# Altium footprint library Ahaltech BMS.PcbLib: 33 footprints (part 2 of 3)
Each footprint in its own frame and in the unit in brackets; x right, y up, seen from the top. Pads: shape width x height; smd on the part's side, far side on the other; paste and mask are expansions set on the pad; w line width, h text height; cw(c..) or ccw(c..) is an arc to the next point about the centre after c.
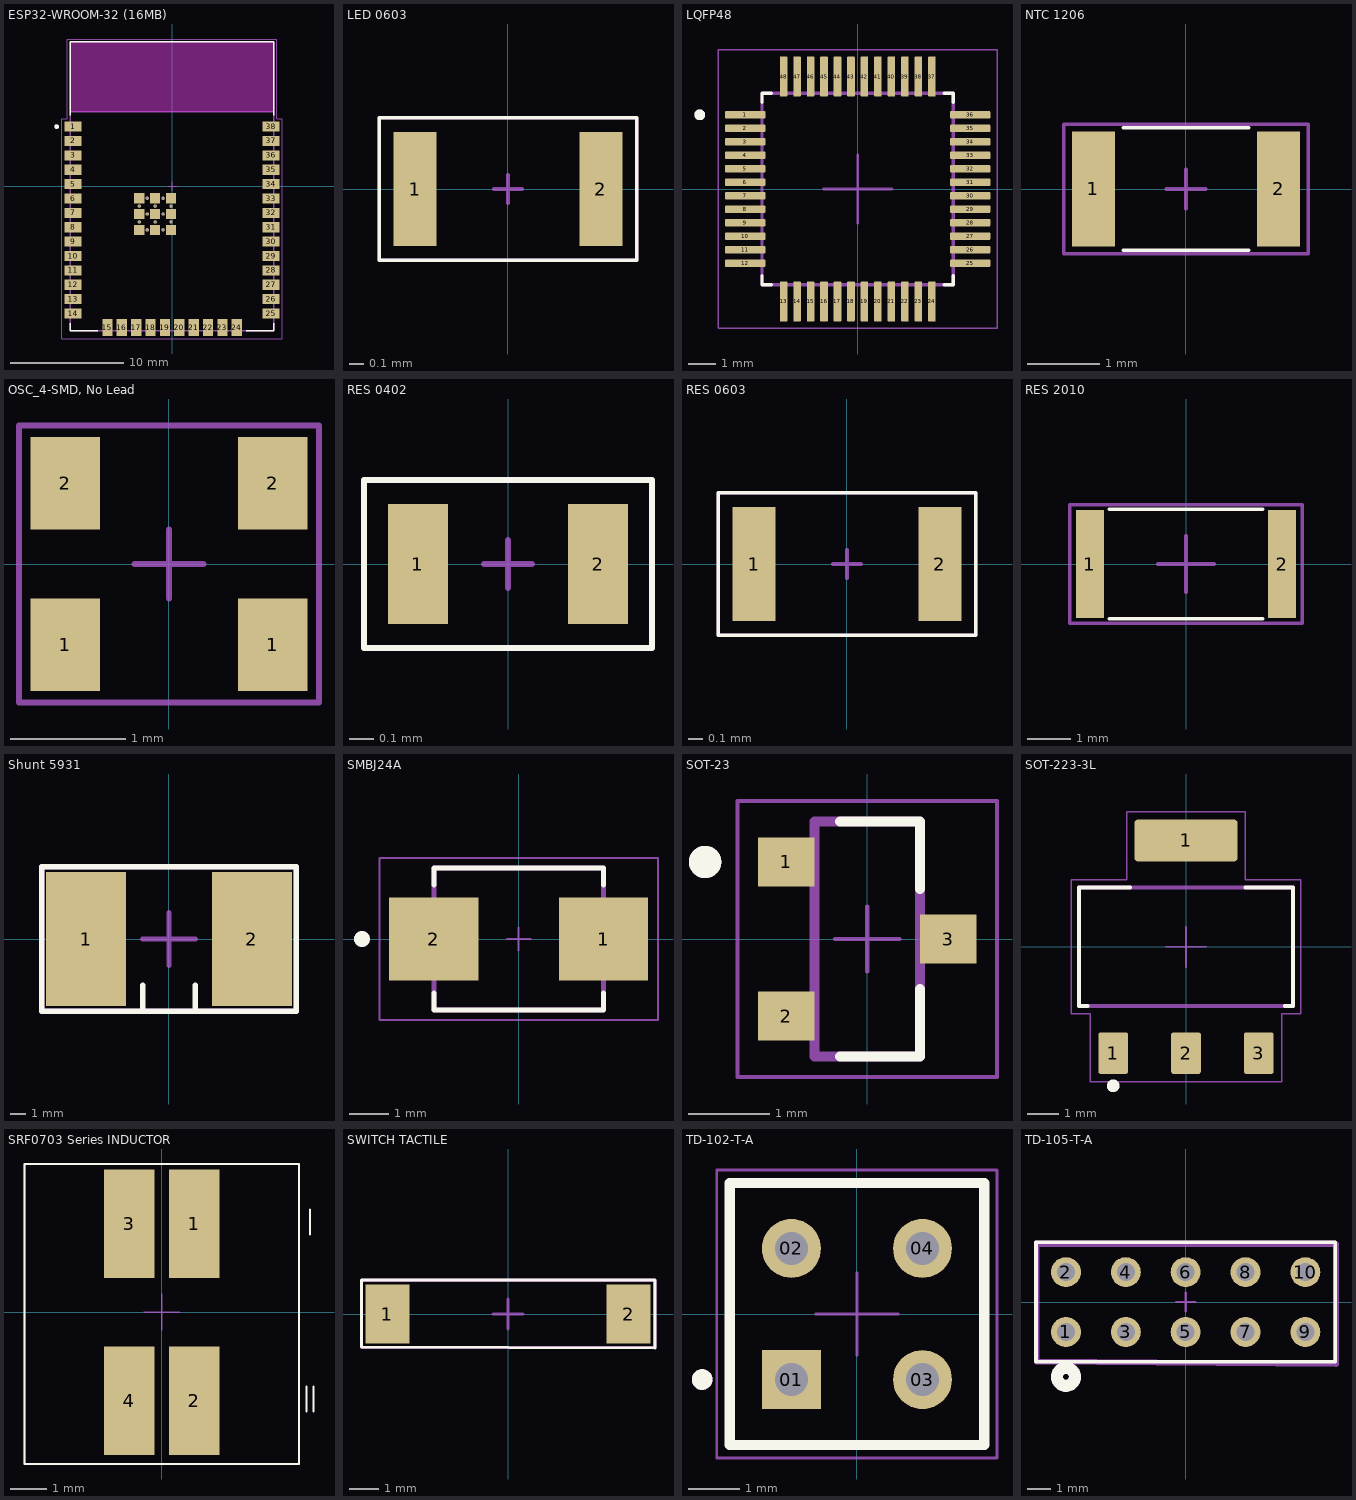
[diagram p1: the footprints below, top view; thin cyan lines are the x and y axes]

## ESP32-WROOM-32 (16MB) [mm]
pads (59):
  rect 1.5x0.9 smd: 1(-8.75,5.26) 2(-8.75,3.99) 3(-8.75,2.72) 4(-8.75,1.45) 5(-8.75,0.18) 6(-8.75,-1.09) 7(-8.75,-2.36) 8(-8.75,-3.63) 9(-8.75,-4.9) 10(-8.75,-6.17) 11(-8.75,-7.44) 12(-8.75,-8.71) 13(-8.75,-9.98) 14(-8.75,-11.25) 25(8.75,-11.25) 26(8.75,-9.98) 27(8.75,-8.71) 28(8.75,-7.44) 29(8.75,-6.17) 30(8.75,-4.9) 31(8.75,-3.63) 32(8.75,-2.36) 33(8.75,-1.09) 34(8.75,0.18) 35(8.75,1.45) 36(8.75,2.72) 37(8.75,3.99) 38(8.75,5.26)
  rect 0.9x1.5 smd: 15(-5.715,-12.5) 16(-4.445,-12.5) 17(-3.175,-12.5) 18(-1.905,-12.5) 19(-0.635,-12.5) 20(0.635,-12.5) 21(1.905,-12.5) 22(3.175,-12.5) 23(4.445,-12.5) 24(5.715,-12.5)
  rect 0.9x0.9 smd: 39_1(-2.9,-1.06) 39_2(-1.5,-1.06) 39_3(-0.1,-1.06) 39_4(-2.9,-2.46) 39_5(-1.5,-2.46) 39_6(-0.1,-2.46) 39_7(-2.9,-3.86) 39_8(-1.5,-3.86) 39_9(-0.1,-3.86)
  round 0.3 hole 0.2 mask+0: 39_10(-2.2,-1.06) 39_11(-0.8,-1.06) 39_12(-2.9,-1.76) 39_13(-1.5,-1.76) 39_14(-0.1,-1.76) 39_15(-2.2,-2.46) 39_16(-0.8,-2.46) 39_17(-2.9,-3.16) 39_18(-1.5,-3.16) 39_19(-0.1,-3.16) 39_20(-2.2,-3.86) 39_21(-0.8,-3.86)
Top Overlay:
  circle w0.2: c-10.2,5.26 r0.1
  lines w0.127: -9,-12.1 -9,-12.75 -6.55,-12.75 ; -9,6.25 -9,12.75 9,12.75 9,6.25 ; 6.55,-12.75 9,-12.75 9,-12.1
Keep-Out Layer:
  region: 9,6.56 -9,6.56 -9,12.75 9,12.75
Top Component Center:
  lines w0.05: -0.4,0 0,0 ; 0,-0.4 0,0 ; 0,0.4 0,0 ; 0.4,0 0,0 ; -9.75,-13.5 -9.75,5.96 -9.25,5.96 -9.25,13 9.25,13 9.25,5.96 9.75,5.96 9.75,-13.5 -9.75,-13.5
Top Designator:
  circle w0.2: c-10.2,5.26 r0.1
  lines w0.127: -9,6.56 9,6.56 ; -9,6.56 -9,12.75 9,12.75 9,6.56 ; -9,6.56 -9,-12.75 9,-12.75 9,6.56
  text ".Designator" at -1.2,-0.234 h2
  text "ANTENNA" at -6,9 h1.78
3D body "step_temp.STEP": height 3.25, standoff 0, extent -9,-12.75 9,12.75

## LED 0603 [mm]
pads (2):
  rect 0.3x0.8 smd mask+0.08: 1(-0.65,0) 2(0.65,0)
Top Overlay:
  lines w0.025: -0.9,-0.5 0.9,-0.5 0.9,0.5 0.2,0.5 -0.9,0.5 -0.9,-0.5
Top Component Center:
  lines w0.025: -0.1,0 0,0 ; 0,-0.1 0,0 ; 0,0.1 0,0 ; 0.1,0 0,0 ; -0.9,-0.5 -0.9,0.5 -0.5,0.5 0.9,0.5 0.9,-0.5 -0.9,-0.5
Top Designator:
  lines w0.025: -0.9,-0.5 -0.9,0.5 -0.2,0.5 0.9,0.5 0.9,-0.5 -0.9,-0.5
  text ".Designator" at -0.017,-0.15 h0.2
3D body "LTST-C190KRKT.STEP": height 0.8, standoff 0, extent -0.8,-0.4 0.8,0.4

## LQFP48 [mm]
pads (48):
  rrect25% 1.49x0.28 smd: 1(-4.17,2.75) 2(-4.17,2.25) 3(-4.17,1.75) 4(-4.17,1.25) 5(-4.17,0.75) 6(-4.17,0.25) 7(-4.17,-0.25) 8(-4.17,-0.75) 9(-4.17,-1.25) 10(-4.17,-1.75) 11(-4.17,-2.25) 12(-4.17,-2.75) 25(4.17,-2.75) 26(4.17,-2.25) 27(4.17,-1.75) 28(4.17,-1.25) 29(4.17,-0.75) 30(4.17,-0.25) 31(4.17,0.25) 32(4.17,0.75) 33(4.17,1.25) 34(4.17,1.75) 35(4.17,2.25) 36(4.17,2.75)
  rrect25% 0.28x1.49 smd: 13(-2.75,-4.17) 14(-2.25,-4.17) 15(-1.75,-4.17) 16(-1.25,-4.17) 17(-0.75,-4.17) 18(-0.25,-4.17) 19(0.25,-4.17) 20(0.75,-4.17) 21(1.25,-4.17) 22(1.75,-4.17) 23(2.25,-4.17) 24(2.75,-4.17) 37(2.75,4.17) 38(2.25,4.17) 39(1.75,4.17) 40(1.25,4.17) 41(0.75,4.17) 42(0.25,4.17) 43(-0.25,4.17) 44(-0.75,4.17) 45(-1.25,4.17) 46(-1.75,4.17) 47(-2.25,4.17) 48(-2.75,4.17)
Top Overlay:
  circle w0.2: c-5.86,2.75 r0.1
  lines w0.127: -3.55,-3.21 -3.55,-3.55 -3.21,-3.55 ; -3.55,3.21 -3.55,3.55 -3.21,3.55 ; 3.21,-3.55 3.55,-3.55 3.55,-3.21 ; 3.21,3.55 3.55,3.55 3.55,3.21
Top Component Center:
  lines w0.05: -5.165,-5.165 5.165,-5.165 5.165,5.165 -5.165,5.165 -5.165,-5.165
  lines w0.1: -1.27,0 0,0 ; 0,-1.27 0,0 ; 0,1.27 0,0 ; 1.27,0 0,0
Top Designator:
  circle w0.2: c-5.86,2.75 r0.1
  lines w0.127: -3.55,-3.55 3.55,-3.55 3.55,3.55 -3.55,3.55 -3.55,-3.55
  text ".Designator" at -0.435,-0.202 h0.7
3D body "STM32G431CBT6.STEP": height 1.58, standoff -0.02, extent -4.5,-4.5 4.5,4.5

## NTC 1206 [mm]
pads (2):
  rect 0.6x1.6 smd mask+0.08: 1(-1.287,0) 2(1.288,0)
Top Overlay:
  lines w0.05: -0.875,-0.85 0.875,-0.85 ; -0.875,0.85 0.875,0.85
Top Component Center:
  lines w0.05: -0.275,0 0,0 ; 0,-0.275 0,0 ; 0,0.275 0,0 ; 0.275,0 0,0 ; 1.7,-0.9 -1.7,-0.9 -1.7,-0.025 -1.7,0.9 -0.962,0.9 1.7,0.9 1.7,0.2 ; 1.7,-0.9 1.7,0.2 ; 1.7,-0.9 1.7,0.2
Top Designator:
  lines w0.05: -1.7,-0.9 1.7,-0.9 1.7,0.9 -1,0.9 -1.7,0.9 -1.7,-0.9
  text ".Designator" at 0.03,-0.205 h0.3
3D body "NC20KC0100KBA.STEP": height 1.6, standoff 0, extent -1.6,-0.75 1.6,0.75

## OSC_4-SMD, No Lead [mm]
pads (4):
  rect 0.6x0.8 smd mask+0.08: 1(-0.9,-0.7) 1(0.9,-0.7) 2(-0.9,0.7) 2(0.9,0.7)
Top Component Center:
  lines w0.05: -0.3,0 0,0 ; 0,-0.3 0,0 ; 0,0.3 0,0 ; 0.3,0 0,0 ; -1.3,-1.2 1.3,-1.2 1.3,1.2 -0.9,1.2 -1.3,1.2 -1.3,-1.2
Top Designator:
  lines w0.05: -1.3,-1.2 1.3,-1.2 1.3,1.2 -0.9,1.2 -1.3,1.2 -1.3,-1.2
  text ".Designator" at 0.03,-0.23 h0.3
3D body "XRCGB25M000F0Z00R0.STEP": height 0.7, standoff 0, extent -1,-0.8 1,0.8

## RES 0402 [mm]
pads (2):
  rect 0.25x0.5 smd mask+0.08: 1(-0.375,0) 2(0.375,0)
Top Overlay:
  lines w0.025: -0.6,-0.35 -0.6,0.35 -0.15,0.35 0.6,0.35 0.6,-0.35 -0.6,-0.35
Top Component Center:
  lines w0.025: -0.1,0 0,0 ; 0,-0.1 0,0 ; 0,0.1 0,0 ; 0.1,0 0,0 ; -0.6,-0.35 0.6,-0.35 0.6,0.35 -0.25,0.35 -0.6,0.35 -0.6,-0.35
Top Designator:
  lines w0.025: -0.6,-0.35 0.6,-0.35 0.6,0.35 -0.1,0.35 -0.6,0.35 -0.6,-0.35
  text ".Designator" at 0.042,-0.075 h0.1
3D body "RK73H1ETTP47R0F.step": height 0.4, standoff 0, extent -0.5,-0.25 0.5,0.25

## RES 0603 [mm]
pads (2):
  rect 0.3x0.8 smd mask+0.08: 1(-0.65,0) 2(0.65,0)
Top Overlay:
  lines w0.025: -0.9,-0.5 0.9,-0.5 0.9,0.5 0.2,0.5 -0.9,0.5 -0.9,-0.5
Top Component Center:
  lines w0.025: -0.1,0 0,0 ; 0,-0.1 0,0 ; 0,0.1 0,0 ; 0.1,0 0,0 ; -0.9,-0.5 -0.9,0.5 -0.5,0.5 0.9,0.5 0.9,-0.5 -0.9,-0.5
Top Designator:
  lines w0.025: -0.9,-0.5 -0.9,0.5 -0.2,0.5 0.9,0.5 0.9,-0.5 -0.9,-0.5
  text ".Designator" at -0.017,-0.15 h0.2
3D body "ERA-3AEB121V.step": height 0.45, standoff 0, extent -0.8,-0.4 0.8,0.4

## RES 2010 [mm]
pads (2):
  rect 0.64x2.46 smd mask+0.08: 1(-2.195,0) 2(2.195,0)
Top Overlay:
  lines w0.08: -1.75,-1.25 1.75,-1.25 ; -1.75,1.25 1.75,1.25
Top Component Center:
  lines w0.08: -0.65,0 0,0 ; 0,-0.65 0,0 ; 0,0.65 0,0 ; 0.65,0 0,0 ; -2.65,-1.35 2.65,-1.35 2.65,1.35 -2.65,1.35 -2.65,-1.35
Top Designator:
  lines w0.08: -2.65,-1.35 -2.65,1.35 2.65,1.35 2.65,-1.35 -2.65,-1.35
  text ".Designator" at -0.067,-0.3 h0.5
3D body "RC2010.stp": height 0.55, standoff 0, extent -2.5,-1.25 2.5,1.25

## Shunt 5931 [mm]
pads (2):
  rect 5.2x8.75 smd mask+0.08: 1(-5.4,0) 2(5.4,0)
Top Overlay:
  lines w0.35: -1.7,-4.7 -1.7,-3 ; 1.7,-4.7 1.7,-3 ; -8.3,-4.7 -8.3,4.7 8.3,4.7 8.3,-4.7 -8.3,-4.7
Top Component Center:
  lines w0.35: -1.7,0 0,0 ; 0,-1.7 0,0 ; 0,1.7 0,0 ; 1.7,0 0,0 ; -8.3,-4.7 -8.3,4.7 -3.3,4.7 8.3,4.7 8.3,-4.7 -8.3,-4.7
Top Designator:
  lines w0.35: -8.3,-4.7 -8.3,4.7 8.3,4.7 8.3,-4.7 -8.3,-4.7
  text ".Designator" at 0.167,-0.6 h1.3
3D body "Shunt_Resistors-PU5931(5931).step": height 1.1, standoff 0, extent -7.6,-3.8 7.4,3.95

## SMBJ24A [mm]
pads (2):
  rect 2.28x2.12 smd: 1(2.165,0) 2(-2.165,0)
Top Overlay:
  circle w0.2: c-4,0 r0.1
  lines w0.127: -2.163,-1.38 -2.163,-1.813 2.163,-1.813 2.163,-1.38 ; -2.163,1.38 -2.163,1.813 2.163,1.813 2.163,1.38
Top Component Center:
  lines w0.05: -0.3,0 0,0 ; 0,-0.3 0,0 ; 0,0.3 0,0 ; 0.3,0 0,0 ; -3.555,-2.063 -3.555,2.063 3.555,2.063 3.555,-2.063 -3.555,-2.063
Top Designator:
  circle w0.2: c-4,0 r0.1
  lines w0.127: -2.163,-1.813 -2.163,1.813 2.163,1.813 2.163,-1.813 -2.163,-1.813
  text ".Designator" at 0.167,-0.4 h0.7
3D body "step_temp.STEP": height 2.65, standoff 0, extent -2.67,-1.813 2.67,1.813

## SOT-23 [mm]
pads (3):
  rect 0.7x0.6 smd paste-0.05: 1(-1,0.95) 2(-1,-0.95) 3(1,0)
Top Overlay:
  circle w0.2: c-2,0.95 r0.1
  lines w0.127: -0.336,-1.45 0.65,-1.45 0.65,-0.62 ; -0.336,1.45 0.65,1.45 0.65,0.62
Top Component Center:
  lines w0.05: -0.4,0 0,0 ; 0,-0.4 0,0 ; 0,0.4 0,0 ; 0.4,0 0,0 ; -1.6,-1.7 1.6,-1.7 1.6,1.7 -1.6,1.7 -1.6,-1.7
Top Designator:
  circle w0.2: c-2,0.95 r0.1
  lines w0.127: -0.65,-1.45 0.65,-1.45 0.65,1.45 -0.65,1.45 -0.65,-1.45
  text ".Designator" at -0.02,0.22 h0.3
3D body "step_temp.STEP": height 1.1, standoff 0, extent -1.15,-1.45 1.15,1.45

## SOT-223-3L [mm]
pads (4):
  rrect15% 0.93x1.31 smd: 1(-2.29,-3.345) 2(0,-3.345) 3(2.29,-3.345)
  rrect15% 3.24x1.31 smd: 1(0,3.345)
Top Overlay:
  circle w0.2: c-2.29,-4.373 r0.1
  lines w0.127: -3.1,-1.86 -3.36,-1.86 -3.36,1.86 -1.76,1.86 ; 1.87,1.86 3.36,1.86 3.36,-1.86 3.11,-1.86
Top Component Center:
  lines w0.05: -0.635,0 0,0 ; 0,-0.635 0,0 ; 0,0.635 0,0 ; 0.635,0 0,0 ; -3.61,-2.11 -3.61,2.11 -1.87,2.11 -1.87,4.25 1.87,4.25 1.87,2.11 3.61,2.11 3.61,-2.11 3.01,-2.11 3.01,-4.25 -3.01,-4.25 -3.01,-2.11 -3.61,-2.11
Top Designator:
  lines w0.127: -3.36,-1.86 -3.36,1.86 3.36,1.86 3.36,-1.86 -3.36,-1.86
  text ".Designator" at -0.562,-0.202 h0.7
3D body "step_temp.STEP": height 1.8, standoff 0, extent -3.15,-3.5 3.15,3.5

## SRF0703 Series INDUCTOR [mm]
pads (4):
  rect 1.4x3 smd mask+0.08: 1(0.9,2.45) 2(0.9,-2.45) 3(-0.9,2.45) 4(-0.9,-2.45)
Top Overlay:
  lines w0.05: 4,-2.75 4,-2.05 ; 4.1,2.15 4.1,2.85 ; 4.2,-2.75 4.2,-2.05 ; -3.8,-4.2 3.8,-4.2 3.8,4.1 -3.8,4.1 -3.8,-4.2
Top Component Center:
  lines w0.05: -0.5,0 0,0 ; 0,-0.5 0,0 ; 0,0.5 0,0 ; 0.5,0 0,0 ; -3.8,-4.2 3.8,-4.2 3.8,4.1 1.6,4.1 -3.8,4.1 -3.8,-4.2
Top Designator:
  lines w0.05: -3.8,-4.2 3.8,-4.2 3.8,4.1 1.6,4.1 -3.8,4.1 -3.8,-4.2
  text ".Designator" at -0.4,-0.167 h0.7
3D body "SRF0703.STP": height 3.4, standoff 0, extent -3.65,-3.65 3.65,3.65

## SWITCH TACTILE [mm]
pads (2):
  rect 1.5x2 smd mask+0.08: 1(-4.1,0) 2(4.1,0)
Top Overlay:
  lines w0.1: -4.975,-1.125 5,-1.15 5,1.15 -4.975,1.15 -4.975,-1.125
Top Component Center:
  lines w0.1: -0.508,0 0,0 ; 0,-0.508 0,0 ; 0,0.508 0,0 ; 0.508,0 0,0 ; -4.98,-1.14 4.98,-1.14 4.98,1.14 4.59,1.14 -3.42,1.14 -4.98,1.14 -4.98,-1.14
Top Designator:
  lines w0.1: -4.975,-1.125 -4.975,1.15 -1.65,1.15 5,1.15 5,-1.15 -4.975,-1.125
  text ".Designator" at -0.4,-0.217 h0.7
3D body "1PTS636SM50SMTRLFS.stp": height 4.3, standoff -0.03, extent -4.3,-1.775 4.3,1.725

## TD-102-T-A [mil]
pads (4):
  rect 45x45 / inner round 45 / far side rect 45x45 hole 25 mask+1.97: 01(-50,-50)
  round 45 hole 25 mask+1.97: 02(-50,50) 03(50,-50) 04(50,50)
Top Overlay:
  circle w7.87: c-118.11,-50 r3.94
  lines w7.87: -97,-100 97,-100 97,100 -97,100 -97,-100
Top Component Center:
  lines w1.97: -31.5,0 0,0 ; 0,-31.5 0,0 ; 0,31.5 0,0 ; 31.5,0 0,0 ; -106.84,-109.84 106.84,-109.84 106.84,109.84 -106.84,109.84 -106.84,-109.84
Top Designator:
  circle w7.87: c-118.11,-50 r3.94
  lines w3.94: -97,-100 97,-100 97,100 -97,100 -97,-100
  text ".Designator" at -23.62,-6.56 h27.56
3D body "TD-102-T-A.stp": height 326, standoff -151, extent -97,-100 97,100

## TD-105-T-A [mil]
pads (10):
  round 50 hole 30: 1(-200,-50) 2(-200,50) 3(-100,-50) 4(-100,50) 5(0,-50) 6(0,50) 7(100,-50) 8(100,50) 9(200,-50) 10(200,50)
Top Overlay:
  lines w6: -250,-100 -250,100 250,100 250,-100 -250,-100
  lines w20: -215,-125 cw(c-200,-125) -185,-125 cw(c-200,-125) -215,-125
Top Component Center:
  lines w3.94: -15.75,0 0,0 ; 0,-15.75 0,0 ; 0,15.75 0,0 ; 15.75,0 0,0
  lines w9.84: -248.82,-99.61 251.18,-103.54 251.18,97.24 -248.82,97.24 -248.82,-99.61
Top Designator:
  lines w6: -250,-100 -250,100 250,100 250,-100 -250,-100
  lines w20: -215,-125 cw(c-200,-125) -185,-125 cw(c-200,-125) -215,-125
  text ".Designator" at -27.56,-10.5 h27.56
3D body "TD-105-T-A.stp": height 326, standoff -151, extent -247,-100 247,100